# Altium schematic symbol library SCHLIB.SchLib: 2608 symbols (part 18 of 20)
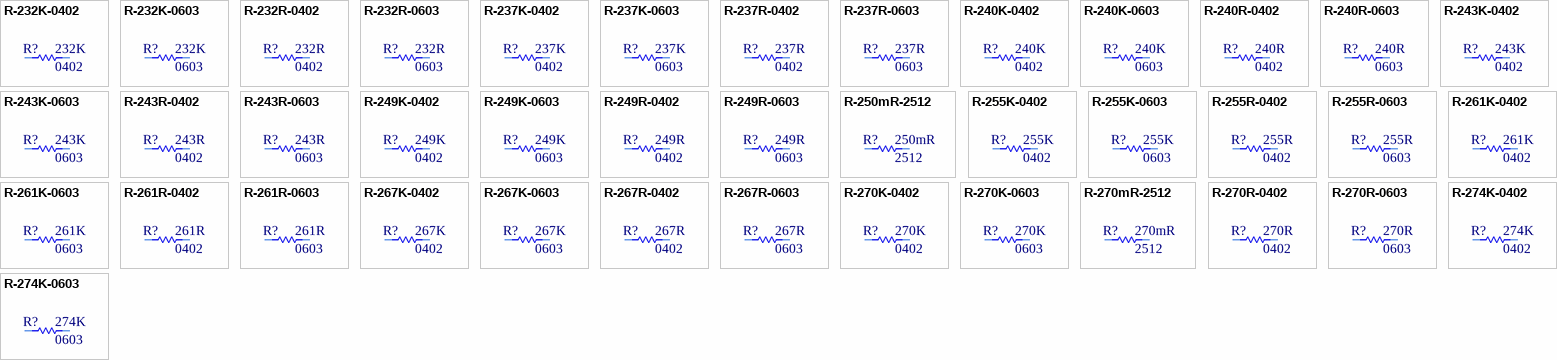
[diagram p100: symbols R-232K-0402 to R-274K-0603]

## R-240K-0402
designator R?, comment Package: 0402  (hidden comment: 240K)
RES 240K OHM 1% 1/16W 0402; Manufacturer Part Number: RC0402FR-07240KL; Manufacturer: YAGEO; Tolerance: 0.01; Power: 0.063W; Temperature Coefficient: ±100ppm/°C; Object  Type: Part; Design Item ID: R-240K-0402; Value: 240K; Composition: Thick Film; Features: Moisture Resistant; Operating Temperature: -55°C ~ 155°C; Height - Seated (Max): 0.40mm; Category: Resistor
footprint R0402
pins: 1, 2

## R-240K-0603
designator R?, comment Package: 0603  (hidden comment: 240K)
RES SMD 240K OHM 1% 1/10W 0603; Manufacturer Part Number: CRCW0603240KFKEA; Manufacturer: Vishay Dale; Tolerance: 0.01; Power: 0.1W; Temperature Coefficient: ±100ppm/°C; Object  Type: Part; Design Item ID: R-240K-0603; Value: 240K; Composition: Thick Film; Features: Automotive AEC-Q200; Operating Temperature: -55°C ~ 155°C; Height - Seated (Max): 0.50mm; Category: Resistor
footprint R0603
pins: 1, 2

## R-240R-0402
designator R?, comment Package: 0402  (hidden comment: 240R)
RES 240 OHM 1% 1/16W 0402; Manufacturer Part Number: RC0402FR-07240RL; Manufacturer: YAGEO; Tolerance: 0.01; Power: 0.063W; Temperature Coefficient: ±100ppm/°C; Object  Type: Part; Design Item ID: R-240R-0402; Value: 240R; Composition: Thick Film; Features: Moisture Resistant; Operating Temperature: -55°C ~ 155°C; Height - Seated (Max): 0.40mm; Category: Resistor
footprint R0402
pins: 1, 2

## R-240R-0603
designator R?, comment Package: 0603  (hidden comment: 240R)
RES SMD 240 OHM 1% 1/10W 0603; Manufacturer Part Number: CRCW0603240RFKEA; Manufacturer: Vishay Dale; Tolerance: 0.01; Power: 0.1W; Temperature Coefficient: ±100ppm/°C; Object  Type: Part; Design Item ID: R-240R-0603; Value: 240R; Composition: Thick Film; Features: Automotive AEC-Q200; Operating Temperature: -55°C ~ 155°C; Height - Seated (Max): 0.50mm; Category: Resistor
footprint R0603
pins: 1, 2

## R-243K-0402
designator R?, comment Package: 0402  (hidden comment: 243K)
RES 243K OHM 1% 1/16W 0402; Manufacturer Part Number: RC0402FR-07243KL; Manufacturer: YAGEO; Tolerance: 0.01; Power: 0.063W; Temperature Coefficient: ±100ppm/°C; Object  Type: Part; Design Item ID: R-243K-0402; Value: 243K; Composition: Thick Film; Features: Moisture Resistant; Operating Temperature: -55°C ~ 155°C; Height - Seated (Max): 0.40mm; Category: Resistor
footprint R0402
pins: 1, 2

## R-243K-0603
designator R?, comment Package: 0603  (hidden comment: 243K)
RES SMD 243K OHM 1% 1/10W 0603; Manufacturer Part Number: CRCW0603243KFKEA; Manufacturer: Vishay Dale; Tolerance: 0.01; Power: 0.1W; Temperature Coefficient: ±100ppm/°C; Object  Type: Part; Design Item ID: R-243K-0603; Value: 243K; Composition: Thick Film; Features: Automotive AEC-Q200; Operating Temperature: -55°C ~ 155°C; Height - Seated (Max): 0.50mm; Category: Resistor
footprint R0603
pins: 1, 2

## R-243R-0402
designator R?, comment Package: 0402  (hidden comment: 243R)
RES 243 OHM 1% 1/16W 0402; Manufacturer Part Number: RC0402FR-07243RL; Manufacturer: YAGEO; Tolerance: 0.01; Power: 0.063W; Temperature Coefficient: ±100ppm/°C; Object  Type: Part; Design Item ID: R-243R-0402; Value: 243R; Composition: Thick Film; Features: Moisture Resistant; Operating Temperature: -55°C ~ 155°C; Height - Seated (Max): 0.40mm; Category: Resistor
footprint R0402
pins: 1, 2

## R-243R-0603
designator R?, comment Package: 0603  (hidden comment: 243R)
RES SMD 243 OHM 1% 1/10W 0603; Manufacturer Part Number: CRCW0603243RFKEA; Manufacturer: Vishay Dale; Tolerance: 0.01; Power: 0.1W; Temperature Coefficient: ±100ppm/°C; Object  Type: Part; Design Item ID: R-243R-0603; Value: 243R; Composition: Thick Film; Features: Automotive AEC-Q200; Operating Temperature: -55°C ~ 155°C; Height - Seated (Max): 0.50mm; Category: Resistor
footprint R0603
pins: 1, 2

## R-249K-0402
designator R?, comment Package: 0402  (hidden comment: 249K)
RES 249K OHM 1% 1/16W 0402; Manufacturer Part Number: RC0402FR-07249KL; Manufacturer: YAGEO; Tolerance: 0.01; Power: 0.063W; Temperature Coefficient: ±100ppm/°C; Object  Type: Part; Design Item ID: R-249K-0402; Value: 249K; Composition: Thick Film; Features: Moisture Resistant; Operating Temperature: -55°C ~ 155°C; Height - Seated (Max): 0.40mm; Category: Resistor
footprint R0402
pins: 1, 2

## R-249K-0603
designator R?, comment Package: 0603  (hidden comment: 249K)
RES SMD 249K OHM 1% 1/10W 0603; Manufacturer Part Number: CRCW0603249KFKEA; Manufacturer: Vishay Dale; Tolerance: 0.01; Power: 0.1W; Temperature Coefficient: ±100ppm/°C; Object  Type: Part; Design Item ID: R-249K-0603; Value: 249K; Composition: Thick Film; Features: Automotive AEC-Q200; Operating Temperature: -55°C ~ 155°C; Height - Seated (Max): 0.50mm; Category: Resistor
footprint R0603
pins: 1, 2

## R-249R-0402
designator R?, comment Package: 0402  (hidden comment: 249R)
RES 249 OHM 1% 1/16W 0402; Manufacturer Part Number: RC0402FR-07249RL; Manufacturer: YAGEO; Tolerance: 0.01; Power: 0.063W; Temperature Coefficient: ±100ppm/°C; Object  Type: Part; Design Item ID: R-249R-0402; Value: 249R; Composition: Thick Film; Features: Moisture Resistant; Operating Temperature: -55°C ~ 155°C; Height - Seated (Max): 0.40mm; Category: Resistor
footprint R0402
pins: 1, 2

## R-249R-0603
designator R?, comment Package: 0603  (hidden comment: 249R)
RES SMD 249 OHM 1% 1/10W 0603; Manufacturer Part Number: CRCW0603249RFKEA; Manufacturer: Vishay Dale; Tolerance: 0.01; Power: 0.1W; Temperature Coefficient: ±100ppm/°C; Object  Type: Part; Design Item ID: R-249R-0603; Value: 249R; Composition: Thick Film; Features: Automotive AEC-Q200; Operating Temperature: -55°C ~ 155°C; Height - Seated (Max): 0.50mm; Category: Resistor
footprint R0603
pins: 1, 2

## R-250mR-2512
designator R?, comment Package: 2512  (hidden comment: 250mR)
RES 0.25 OHM 1% 1W 2512; Manufacturer Part Number: WSL2512R2500FEA; Manufacturer: Vishay Dale; Tolerance: 0.01; Temperature Coefficient: ±75ppm/°C; Object  Type: Part; Design Item ID: R-250mR-2512; Value: 250mR; Power: 1W; Composition: Metal Element; Features: Anti-Sulfur, Automotive AEC-Q200, Current Sense, Moisture Resistant, Pulse Withstanding; Operating Temperature: -65°C ~ 170°C; Height - Seated (Max): 0.89mm; Category: Resistor
footprint R2512
pins: 1, 2

## R-255K-0402
designator R?, comment Package: 0402  (hidden comment: 255K)
RES 255K OHM 1% 1/16W 0402; Manufacturer Part Number: RC0402FR-07255KL; Manufacturer: YAGEO; Tolerance: 0.01; Power: 0.063W; Temperature Coefficient: ±100ppm/°C; Object  Type: Part; Design Item ID: R-255K-0402; Value: 255K; Composition: Thick Film; Features: Moisture Resistant; Operating Temperature: -55°C ~ 155°C; Height - Seated (Max): 0.40mm; Category: Resistor
footprint R0402
pins: 1, 2

## R-255K-0603
designator R?, comment Package: 0603  (hidden comment: 255K)
RES SMD 255K OHM 1% 1/10W 0603; Manufacturer Part Number: CRCW0603255KFKEA; Manufacturer: Vishay Dale; Tolerance: 0.01; Power: 0.1W; Temperature Coefficient: ±100ppm/°C; Object  Type: Part; Design Item ID: R-255K-0603; Value: 255K; Composition: Thick Film; Features: Automotive AEC-Q200; Operating Temperature: -55°C ~ 155°C; Height - Seated (Max): 0.50mm; Category: Resistor
footprint R0603
pins: 1, 2

## R-255R-0402
designator R?, comment Package: 0402  (hidden comment: 255R)
RES 255 OHM 1% 1/16W 0402; Manufacturer Part Number: RC0402FR-07255RL; Manufacturer: YAGEO; Tolerance: 0.01; Power: 0.063W; Temperature Coefficient: ±100ppm/°C; Object  Type: Part; Design Item ID: R-255R-0402; Value: 255R; Composition: Thick Film; Features: Moisture Resistant; Operating Temperature: -55°C ~ 155°C; Height - Seated (Max): 0.40mm; Category: Resistor
footprint R0402
pins: 1, 2

## R-255R-0603
designator R?, comment Package: 0603  (hidden comment: 255R)
RES SMD 255 OHM 1% 1/10W 0603; Manufacturer Part Number: CRCW0603255RFKEA; Manufacturer: Vishay Dale; Tolerance: 0.01; Power: 0.1W; Temperature Coefficient: ±100ppm/°C; Object  Type: Part; Design Item ID: R-255R-0603; Value: 255R; Composition: Thick Film; Features: Automotive AEC-Q200; Operating Temperature: -55°C ~ 155°C; Height - Seated (Max): 0.50mm; Category: Resistor
footprint R0603
pins: 1, 2

## R-261K-0402
designator R?, comment Package: 0402  (hidden comment: 261K)
RES 261K OHM 1% 1/16W 0402; Manufacturer Part Number: RC0402FR-07261KL; Manufacturer: YAGEO; Tolerance: 0.01; Power: 0.063W; Temperature Coefficient: ±100ppm/°C; Object  Type: Part; Design Item ID: R-261K-0402; Value: 261K; Composition: Thick Film; Features: Moisture Resistant; Operating Temperature: -55°C ~ 155°C; Height - Seated (Max): 0.40mm; Category: Resistor
footprint R0402
pins: 1, 2

## R-261K-0603
designator R?, comment Package: 0603  (hidden comment: 261K)
RES SMD 261K OHM 1% 1/10W 0603; Manufacturer Part Number: CRCW0603261KFKEA; Manufacturer: Vishay Dale; Tolerance: 0.01; Power: 0.1W; Temperature Coefficient: ±100ppm/°C; Object  Type: Part; Design Item ID: R-261K-0603; Value: 261K; Composition: Thick Film; Features: Automotive AEC-Q200; Operating Temperature: -55°C ~ 155°C; Height - Seated (Max): 0.50mm; Category: Resistor
footprint R0603
pins: 1, 2

## R-261R-0402
designator R?, comment Package: 0402  (hidden comment: 261R)
RES 261 OHM 1% 1/16W 0402; Manufacturer Part Number: RC0402FR-07261RL; Manufacturer: YAGEO; Tolerance: 0.01; Power: 0.063W; Temperature Coefficient: ±100ppm/°C; Object  Type: Part; Design Item ID: R-261R-0402; Value: 261R; Composition: Thick Film; Features: Moisture Resistant; Operating Temperature: -55°C ~ 155°C; Height - Seated (Max): 0.40mm; Category: Resistor
footprint R0402
pins: 1, 2

## R-261R-0603
designator R?, comment Package: 0603  (hidden comment: 261R)
RES SMD 261 OHM 1% 1/10W 0603; Manufacturer Part Number: CRCW0603261RFKEA; Manufacturer: Vishay Dale; Tolerance: 0.01; Power: 0.1W; Temperature Coefficient: ±100ppm/°C; Object  Type: Part; Design Item ID: R-261R-0603; Value: 261R; Composition: Thick Film; Features: Automotive AEC-Q200; Operating Temperature: -55°C ~ 155°C; Height - Seated (Max): 0.50mm; Category: Resistor
footprint R0603
pins: 1, 2

## R-267K-0402
designator R?, comment Package: 0402  (hidden comment: 267K)
RES 267K OHM 1% 1/16W 0402; Manufacturer Part Number: RC0402FR-07267KL; Manufacturer: YAGEO; Tolerance: 0.01; Power: 0.063W; Temperature Coefficient: ±100ppm/°C; Object  Type: Part; Design Item ID: R-267K-0402; Value: 267K; Composition: Thick Film; Features: Moisture Resistant; Operating Temperature: -55°C ~ 155°C; Height - Seated (Max): 0.40mm; Category: Resistor
footprint R0402
pins: 1, 2

## R-267K-0603
designator R?, comment Package: 0603  (hidden comment: 267K)
RES SMD 267K OHM 1% 1/10W 0603; Manufacturer Part Number: CRCW0603267KFKEA; Manufacturer: Vishay Dale; Tolerance: 0.01; Power: 0.1W; Temperature Coefficient: ±100ppm/°C; Object  Type: Part; Design Item ID: R-267K-0603; Value: 267K; Composition: Thick Film; Features: Automotive AEC-Q200; Operating Temperature: -55°C ~ 155°C; Height - Seated (Max): 0.50mm; Category: Resistor
footprint R0603
pins: 1, 2

## R-267R-0402
designator R?, comment Package: 0402  (hidden comment: 267R)
RES 267 OHM 1% 1/16W 0402; Manufacturer Part Number: RC0402FR-07267RL; Manufacturer: YAGEO; Tolerance: 0.01; Power: 0.063W; Temperature Coefficient: ±100ppm/°C; Object  Type: Part; Design Item ID: R-267R-0402; Value: 267R; Composition: Thick Film; Features: Moisture Resistant; Operating Temperature: -55°C ~ 155°C; Height - Seated (Max): 0.40mm; Category: Resistor
footprint R0402
pins: 1, 2

## R-267R-0603
designator R?, comment Package: 0603  (hidden comment: 267R)
RES SMD 267 OHM 1% 1/10W 0603; Manufacturer Part Number: CRCW0603267RFKEA; Manufacturer: Vishay Dale; Tolerance: 0.01; Power: 0.1W; Temperature Coefficient: ±100ppm/°C; Object  Type: Part; Design Item ID: R-267R-0603; Value: 267R; Composition: Thick Film; Features: Automotive AEC-Q200; Operating Temperature: -55°C ~ 155°C; Height - Seated (Max): 0.50mm; Category: Resistor
footprint R0603
pins: 1, 2

## R-270K-0402
designator R?, comment Package: 0402  (hidden comment: 270K)
RES 270K OHM 1% 1/16W 0402; Manufacturer Part Number: RC0402FR-07270KL; Manufacturer: YAGEO; Tolerance: 0.01; Power: 0.063W; Temperature Coefficient: ±100ppm/°C; Object  Type: Part; Design Item ID: R-270K-0402; Value: 270K; Composition: Thick Film; Features: Moisture Resistant; Operating Temperature: -55°C ~ 155°C; Height - Seated (Max): 0.40mm; Category: Resistor
footprint R0402
pins: 1, 2

## R-270K-0603
designator R?, comment Package: 0603  (hidden comment: 270K)
RES SMD 270K OHM 1% 1/10W 0603; Manufacturer Part Number: CRCW0603270KFKEA; Manufacturer: Vishay Dale; Tolerance: 0.01; Power: 0.1W; Temperature Coefficient: ±100ppm/°C; Object  Type: Part; Design Item ID: R-270K-0603; Value: 270K; Composition: Thick Film; Features: Automotive AEC-Q200; Operating Temperature: -55°C ~ 155°C; Height - Seated (Max): 0.50mm; Category: Resistor
footprint R0603
pins: 1, 2

## R-270mR-2512
designator R?, comment Package: 2512  (hidden comment: 270mR)
RES 0.27 OHM 1% 1W 2512; Manufacturer Part Number: WSL2512R2700FEA; Manufacturer: Vishay Dale; Tolerance: 0.01; Temperature Coefficient: ±75ppm/°C; Object  Type: Part; Design Item ID: R-270mR-2512; Value: 270mR; Power: 1W; Composition: Metal Element; Features: Anti-Sulfur, Automotive AEC-Q200, Current Sense, Moisture Resistant, Pulse Withstanding; Operating Temperature: -65°C ~ 170°C; Height - Seated (Max): 0.89mm; Category: Resistor
footprint R2512
pins: 1, 2

## R-270R-0402
designator R?, comment Package: 0402  (hidden comment: 270R)
RES 270 OHM 1% 1/16W 0402; Manufacturer Part Number: RC0402FR-07270RL; Manufacturer: YAGEO; Tolerance: 0.01; Power: 0.063W; Temperature Coefficient: ±100ppm/°C; Object  Type: Part; Design Item ID: R-270R-0402; Value: 270R; Composition: Thick Film; Features: Moisture Resistant; Operating Temperature: -55°C ~ 155°C; Height - Seated (Max): 0.40mm; Category: Resistor
footprint R0402
pins: 1, 2

## R-270R-0603
designator R?, comment Package: 0603  (hidden comment: 270R)
RES SMD 270 OHM 1% 1/10W 0603; Manufacturer Part Number: CRCW0603270RFKEA; Manufacturer: Vishay Dale; Tolerance: 0.01; Power: 0.1W; Temperature Coefficient: ±100ppm/°C; Object  Type: Part; Design Item ID: R-270R-0603; Value: 270R; Composition: Thick Film; Features: Automotive AEC-Q200; Operating Temperature: -55°C ~ 155°C; Height - Seated (Max): 0.50mm; Category: Resistor
footprint R0603
pins: 1, 2

## R-274K-0402
designator R?, comment Package: 0402  (hidden comment: 274K)
RES 274K OHM 1% 1/16W 0402; Manufacturer Part Number: RC0402FR-07274KL; Manufacturer: YAGEO; Tolerance: 0.01; Power: 0.063W; Temperature Coefficient: ±100ppm/°C; Object  Type: Part; Design Item ID: R-274K-0402; Value: 274K; Composition: Thick Film; Features: Moisture Resistant; Operating Temperature: -55°C ~ 155°C; Height - Seated (Max): 0.40mm; Category: Resistor
footprint R0402
pins: 1, 2

## R-274K-0603
designator R?, comment Package: 0603  (hidden comment: 274K)
RES SMD 274K OHM 1% 1/10W 0603; Manufacturer Part Number: CRCW0603274KFKEA; Manufacturer: Vishay Dale; Tolerance: 0.01; Power: 0.1W; Temperature Coefficient: ±100ppm/°C; Object  Type: Part; Design Item ID: R-274K-0603; Value: 274K; Composition: Thick Film; Features: Automotive AEC-Q200; Operating Temperature: -55°C ~ 155°C; Height - Seated (Max): 0.50mm; Category: Resistor
footprint R0603
pins: 1, 2

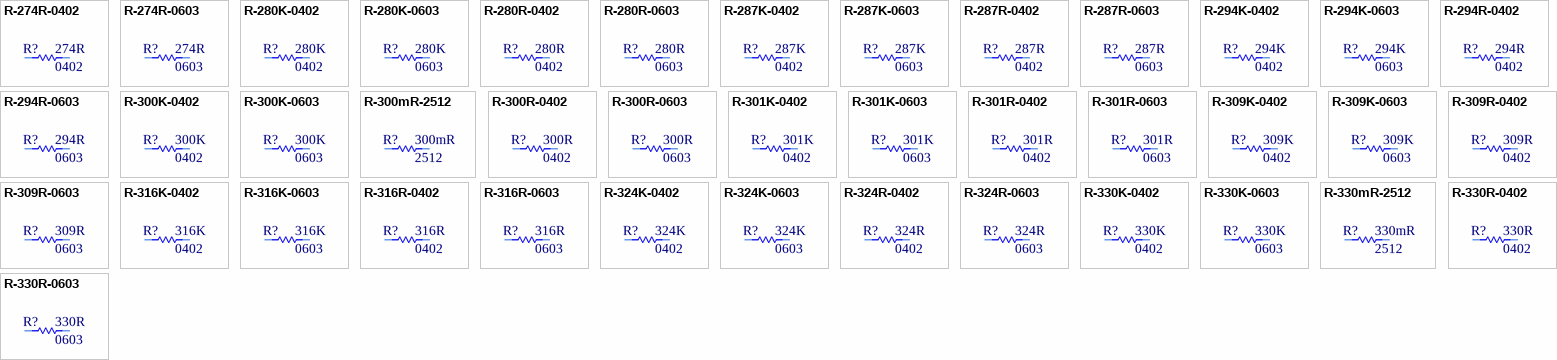
[diagram p75: symbols R-274R-0402 to R-330R-0603]

## R-274R-0402
designator R?, comment Package: 0402  (hidden comment: 274R)
RES 274 OHM 1% 1/16W 0402; Manufacturer Part Number: RC0402FR-07274RL; Manufacturer: YAGEO; Tolerance: 0.01; Power: 0.063W; Temperature Coefficient: ±100ppm/°C; Object  Type: Part; Design Item ID: R-274R-0402; Value: 274R; Composition: Thick Film; Features: Moisture Resistant; Operating Temperature: -55°C ~ 155°C; Height - Seated (Max): 0.40mm; Category: Resistor
footprint R0402
pins: 1, 2

## R-274R-0603
designator R?, comment Package: 0603  (hidden comment: 274R)
RES SMD 274 OHM 1% 1/10W 0603; Manufacturer Part Number: CRCW0603274RFKEA; Manufacturer: Vishay Dale; Tolerance: 0.01; Power: 0.1W; Temperature Coefficient: ±100ppm/°C; Object  Type: Part; Design Item ID: R-274R-0603; Value: 274R; Composition: Thick Film; Features: Automotive AEC-Q200; Operating Temperature: -55°C ~ 155°C; Height - Seated (Max): 0.50mm; Category: Resistor
footprint R0603
pins: 1, 2

## R-280K-0402
designator R?, comment Package: 0402  (hidden comment: 280K)
RES 280K OHM 1% 1/16W 0402; Manufacturer Part Number: RC0402FR-07280KL; Manufacturer: YAGEO; Tolerance: 0.01; Power: 0.063W; Temperature Coefficient: ±100ppm/°C; Object  Type: Part; Design Item ID: R-280K-0402; Value: 280K; Composition: Thick Film; Features: Moisture Resistant; Operating Temperature: -55°C ~ 155°C; Height - Seated (Max): 0.40mm; Category: Resistor
footprint R0402
pins: 1, 2

## R-280K-0603
designator R?, comment Package: 0603  (hidden comment: 280K)
RES SMD 280K OHM 1% 1/10W 0603; Manufacturer Part Number: CRCW0603280KFKEA; Manufacturer: Vishay Dale; Tolerance: 0.01; Power: 0.1W; Temperature Coefficient: ±100ppm/°C; Object  Type: Part; Design Item ID: R-280K-0603; Value: 280K; Composition: Thick Film; Features: Automotive AEC-Q200; Operating Temperature: -55°C ~ 155°C; Height - Seated (Max): 0.50mm; Category: Resistor
footprint R0603
pins: 1, 2

## R-280R-0402
designator R?, comment Package: 0402  (hidden comment: 280R)
RES 280 OHM 1% 1/16W 0402; Manufacturer Part Number: RC0402FR-07280RL; Manufacturer: YAGEO; Tolerance: 0.01; Power: 0.063W; Temperature Coefficient: ±100ppm/°C; Object  Type: Part; Design Item ID: R-280R-0402; Value: 280R; Composition: Thick Film; Features: Moisture Resistant; Operating Temperature: -55°C ~ 155°C; Height - Seated (Max): 0.40mm; Category: Resistor
footprint R0402
pins: 1, 2

## R-280R-0603
designator R?, comment Package: 0603  (hidden comment: 280R)
RES SMD 280 OHM 1% 1/10W 0603; Manufacturer Part Number: CRCW0603280RFKEA; Manufacturer: Vishay Dale; Tolerance: 0.01; Power: 0.1W; Temperature Coefficient: ±100ppm/°C; Object  Type: Part; Design Item ID: R-280R-0603; Value: 280R; Composition: Thick Film; Features: Automotive AEC-Q200; Operating Temperature: -55°C ~ 155°C; Height - Seated (Max): 0.50mm; Category: Resistor
footprint R0603
pins: 1, 2

## R-287K-0402
designator R?, comment Package: 0402  (hidden comment: 287K)
RES 287K OHM 1% 1/16W 0402; Manufacturer Part Number: RC0402FR-07287KL; Manufacturer: YAGEO; Tolerance: 0.01; Power: 0.063W; Temperature Coefficient: ±100ppm/°C; Object  Type: Part; Design Item ID: R-287K-0402; Value: 287K; Composition: Thick Film; Features: Moisture Resistant; Operating Temperature: -55°C ~ 155°C; Height - Seated (Max): 0.40mm; Category: Resistor
footprint R0402
pins: 1, 2

## R-287K-0603
designator R?, comment Package: 0603  (hidden comment: 287K)
RES SMD 287K OHM 1% 1/10W 0603; Manufacturer Part Number: CRCW0603287KFKEA; Manufacturer: Vishay Dale; Tolerance: 0.01; Power: 0.1W; Temperature Coefficient: ±100ppm/°C; Object  Type: Part; Design Item ID: R-287K-0603; Composition: Thick Film; Features: Automotive AEC-Q200; Operating Temperature: -55°C ~ 155°C; Height - Seated (Max): 0.50mm; Category: Resistor; Value: 287K
footprint R0603
pins: 1, 2

## R-287R-0402
designator R?, comment Package: 0402  (hidden comment: 287R)
RES 287 OHM 1% 1/16W 0402; Manufacturer Part Number: RC0402FR-07287RL; Manufacturer: YAGEO; Tolerance: 0.01; Power: 0.063W; Temperature Coefficient: ±100ppm/°C; Object  Type: Part; Design Item ID: R-287R-0402; Value: 287R; Composition: Thick Film; Features: Moisture Resistant; Operating Temperature: -55°C ~ 155°C; Height - Seated (Max): 0.40mm; Category: Resistor
footprint R0402
pins: 1, 2

## R-287R-0603
designator R?, comment Package: 0603  (hidden comment: 287R)
RES SMD 287 OHM 1% 1/10W 0603; Manufacturer Part Number: CRCW0603287RFKEA; Manufacturer: Vishay Dale; Tolerance: 0.01; Power: 0.1W; Temperature Coefficient: ±100ppm/°C; Object  Type: Part; Design Item ID: R-287R-0603; Value: 287R; Composition: Thick Film; Features: Automotive AEC-Q200; Operating Temperature: -55°C ~ 155°C; Height - Seated (Max): 0.50mm; Category: Resistor
footprint R0603
pins: 1, 2

## R-294K-0402
designator R?, comment Package: 0402  (hidden comment: 294K)
RES 294K OHM 1% 1/16W 0402; Manufacturer Part Number: RC0402FR-07294KL; Manufacturer: YAGEO; Tolerance: 0.01; Power: 0.063W; Temperature Coefficient: ±100ppm/°C; Object  Type: Part; Design Item ID: R-294K-0402; Value: 294K; Composition: Thick Film; Features: Moisture Resistant; Operating Temperature: -55°C ~ 155°C; Height - Seated (Max): 0.40mm; Category: Resistor
footprint R0402
pins: 1, 2

## R-294K-0603
designator R?, comment Package: 0603  (hidden comment: 294K)
RES SMD 294K OHM 1% 1/10W 0603; Manufacturer Part Number: CRCW0603294KFKEA; Manufacturer: Vishay Dale; Tolerance: 0.01; Power: 0.1W; Temperature Coefficient: ±100ppm/°C; Object  Type: Part; Design Item ID: R-294K-0603; Value: 294K; Composition: Thick Film; Features: Automotive AEC-Q200; Operating Temperature: -55°C ~ 155°C; Height - Seated (Max): 0.50mm; Category: Resistor
footprint R0603
pins: 1, 2

## R-294R-0402
designator R?, comment Package: 0402  (hidden comment: 294R)
RES 294 OHM 1% 1/16W 0402; Manufacturer Part Number: RC0402FR-07294RL; Manufacturer: YAGEO; Tolerance: 0.01; Power: 0.063W; Temperature Coefficient: ±100ppm/°C; Object  Type: Part; Design Item ID: R-294R-0402; Value: 294R; Composition: Thick Film; Features: Moisture Resistant; Operating Temperature: -55°C ~ 155°C; Height - Seated (Max): 0.40mm; Category: Resistor
footprint R0402
pins: 1, 2

## R-294R-0603
designator R?, comment Package: 0603  (hidden comment: 294R)
RES SMD 294 OHM 1% 1/10W 0603; Manufacturer Part Number: CRCW0603294RFKEA; Manufacturer: Vishay Dale; Tolerance: 0.01; Power: 0.1W; Temperature Coefficient: ±100ppm/°C; Object  Type: Part; Design Item ID: R-294R-0603; Value: 294R; Composition: Thick Film; Features: Automotive AEC-Q200; Operating Temperature: -55°C ~ 155°C; Height - Seated (Max): 0.50mm; Category: Resistor
footprint R0603
pins: 1, 2

## R-300K-0402
designator R?, comment Package: 0402  (hidden comment: 300K)
RES 300K OHM 1% 1/16W 0402; Manufacturer Part Number: RC0402FR-07300KL; Manufacturer: YAGEO; Tolerance: 0.01; Power: 0.063W; Temperature Coefficient: ±100ppm/°C; Object  Type: Part; Design Item ID: R-300K-0402; Value: 300K; Composition: Thick Film; Features: Moisture Resistant; Operating Temperature: -55°C ~ 155°C; Height - Seated (Max): 0.40mm; Category: Resistor
footprint R0402
pins: 1, 2

## R-300K-0603
designator R?, comment Package: 0603  (hidden comment: 300K)
RES SMD 300K OHM 1% 1/10W 0603; Manufacturer Part Number: CRCW0603300KFKEA; Manufacturer: Vishay Dale; Tolerance: 0.01; Power: 0.1W; Temperature Coefficient: ±100ppm/°C; Object  Type: Part; Design Item ID: R-300K-0603; Value: 300K; Composition: Thick Film; Features: Automotive AEC-Q200; Operating Temperature: -55°C ~ 155°C; Height - Seated (Max): 0.50mm; Category: Resistor
footprint R0603
pins: 1, 2

## R-300mR-2512
designator R?, comment Package: 2512  (hidden comment: 300mR)
RES 0.3 OHM 1% 1W 2512; Manufacturer Part Number: WSL2512R3000FEA; Manufacturer: Vishay Dale; Tolerance: 0.01; Temperature Coefficient: ±75ppm/°C; Object  Type: Part; Design Item ID: R-300mR-2512; Value: 300mR; Power: 1W; Composition: Metal Element; Features: Anti-Sulfur, Automotive AEC-Q200, Current Sense, Moisture Resistant, Pulse Withstanding; Operating Temperature: -65°C ~ 170°C; Height - Seated (Max): 0.89mm; Category: Resistor
footprint R2512
pins: 1, 2

## R-300R-0402
designator R?, comment Package: 0402  (hidden comment: 300R)
RES 300 OHM 1% 1/16W 0402; Manufacturer Part Number: RC0402FR-07300RL; Manufacturer: YAGEO; Tolerance: 0.01; Power: 0.063W; Temperature Coefficient: ±100ppm/°C; Object  Type: Part; Design Item ID: R-300R-0402; Value: 300R; Composition: Thick Film; Features: Moisture Resistant; Operating Temperature: -55°C ~ 155°C; Height - Seated (Max): 0.40mm; Category: Resistor
footprint R0402
pins: 1, 2

## R-300R-0603
designator R?, comment Package: 0603  (hidden comment: 300R)
RES SMD 300 OHM 1% 1/10W 0603; Manufacturer Part Number: CRCW0603300RFKEA; Manufacturer: Vishay Dale; Tolerance: 0.01; Power: 0.1W; Temperature Coefficient: ±100ppm/°C; Object  Type: Part; Design Item ID: R-300R-0603; Value: 300R; Composition: Thick Film; Features: Automotive AEC-Q200; Operating Temperature: -55°C ~ 155°C; Height - Seated (Max): 0.50mm; Category: Resistor
footprint R0603
pins: 1, 2

## R-301K-0402
designator R?, comment Package: 0402  (hidden comment: 301K)
RES 301K OHM 1% 1/16W 0402; Manufacturer Part Number: RC0402FR-07301KL; Manufacturer: YAGEO; Tolerance: 0.01; Power: 0.063W; Temperature Coefficient: ±100ppm/°C; Object  Type: Part; Design Item ID: R-301K-0402; Value: 301K; Composition: Thick Film; Features: Moisture Resistant; Operating Temperature: -55°C ~ 155°C; Height - Seated (Max): 0.40mm; Category: Resistor
footprint R0402
pins: 1, 2

## R-301K-0603
designator R?, comment Package: 0603  (hidden comment: 301K)
RES SMD 301K OHM 1% 1/10W 0603; Manufacturer Part Number: CRCW0603301KFKEA; Manufacturer: Vishay Dale; Tolerance: 0.01; Power: 0.1W; Temperature Coefficient: ±100ppm/°C; Object  Type: Part; Design Item ID: R-301K-0603; Value: 301K; Composition: Thick Film; Features: Automotive AEC-Q200; Operating Temperature: -55°C ~ 155°C; Height - Seated (Max): 0.50mm; Category: Resistor
footprint R0603
pins: 1, 2

## R-301R-0402
designator R?, comment Package: 0402  (hidden comment: 301R)
RES 301 OHM 1% 1/16W 0402; Manufacturer Part Number: RC0402FR-07301RL; Manufacturer: YAGEO; Tolerance: 0.01; Power: 0.063W; Temperature Coefficient: ±100ppm/°C; Object  Type: Part; Design Item ID: R-301R-0402; Value: 301R; Composition: Thick Film; Features: Moisture Resistant; Operating Temperature: -55°C ~ 155°C; Height - Seated (Max): 0.40mm; Category: Resistor
footprint R0402
pins: 1, 2

## R-301R-0603
designator R?, comment Package: 0603  (hidden comment: 301R)
RES SMD 301 OHM 1% 1/10W 0603; Manufacturer Part Number: CRCW0603301RFKEA; Manufacturer: Vishay Dale; Tolerance: 0.01; Power: 0.1W; Temperature Coefficient: ±100ppm/°C; Object  Type: Part; Design Item ID: R-301R-0603; Value: 301R; Composition: Thick Film; Features: Automotive AEC-Q200; Operating Temperature: -55°C ~ 155°C; Height - Seated (Max): 0.50mm; Category: Resistor
footprint R0603
pins: 1, 2

## R-309K-0402
designator R?, comment Package: 0402  (hidden comment: 309K)
RES 309K OHM 1% 1/16W 0402; Manufacturer Part Number: RC0402FR-07309KL; Manufacturer: YAGEO; Tolerance: 0.01; Power: 0.063W; Temperature Coefficient: ±100ppm/°C; Object  Type: Part; Design Item ID: R-309K-0402; Value: 309K; Composition: Thick Film; Features: Moisture Resistant; Operating Temperature: -55°C ~ 155°C; Height - Seated (Max): 0.40mm; Category: Resistor
footprint R0402
pins: 1, 2

## R-309K-0603
designator R?, comment Package: 0603  (hidden comment: 309K)
RES SMD 309K OHM 1% 1/10W 0603; Manufacturer Part Number: CRCW0603309KFKEA; Manufacturer: Vishay Dale; Tolerance: 0.01; Power: 0.1W; Temperature Coefficient: ±100ppm/°C; Object  Type: Part; Design Item ID: R-309K-0603; Value: 309K; Composition: Thick Film; Features: Automotive AEC-Q200; Operating Temperature: -55°C ~ 155°C; Height - Seated (Max): 0.50mm; Category: Resistor
footprint R0603
pins: 1, 2

## R-309R-0402
designator R?, comment Package: 0402  (hidden comment: 309R)
RES 309 OHM 1% 1/16W 0402; Manufacturer Part Number: RC0402FR-07309RL; Manufacturer: YAGEO; Tolerance: 0.01; Power: 0.063W; Temperature Coefficient: ±100ppm/°C; Object  Type: Part; Design Item ID: R-309R-0402; Value: 309R; Composition: Thick Film; Features: Moisture Resistant; Operating Temperature: -55°C ~ 155°C; Height - Seated (Max): 0.40mm; Category: Resistor
footprint R0402
pins: 1, 2

## R-309R-0603
designator R?, comment Package: 0603  (hidden comment: 309R)
RES SMD 309 OHM 1% 1/10W 0603; Manufacturer Part Number: CRCW0603309RFKEA; Manufacturer: Vishay Dale; Tolerance: 0.01; Power: 0.1W; Temperature Coefficient: ±100ppm/°C; Object  Type: Part; Design Item ID: R-309R-0603; Value: 309R; Composition: Thick Film; Features: Automotive AEC-Q200; Operating Temperature: -55°C ~ 155°C; Height - Seated (Max): 0.50mm; Category: Resistor
footprint R0603
pins: 1, 2

## R-316K-0402
designator R?, comment Package: 0402  (hidden comment: 316K)
RES 316K OHM 1% 1/16W 0402; Manufacturer Part Number: RC0402FR-07316KL; Manufacturer: YAGEO; Tolerance: 0.01; Power: 0.063W; Temperature Coefficient: ±100ppm/°C; Object  Type: Part; Design Item ID: R-316K-0402; Value: 316K; Composition: Thick Film; Features: Moisture Resistant; Operating Temperature: -55°C ~ 155°C; Height - Seated (Max): 0.40mm; Category: Resistor
footprint R0402
pins: 1, 2

## R-316K-0603
designator R?, comment Package: 0603  (hidden comment: 316K)
RES SMD 316K OHM 1% 1/10W 0603; Manufacturer Part Number: CRCW0603316KFKEA; Manufacturer: Vishay Dale; Tolerance: 0.01; Power: 0.1W; Temperature Coefficient: ±100ppm/°C; Object  Type: Part; Design Item ID: R-316K-0603; Value: 316K; Composition: Thick Film; Features: Automotive AEC-Q200; Operating Temperature: -55°C ~ 155°C; Height - Seated (Max): 0.50mm; Category: Resistor
footprint R0603
pins: 1, 2

## R-316R-0402
designator R?, comment Package: 0402  (hidden comment: 316R)
RES 316 OHM 1% 1/16W 0402; Manufacturer Part Number: RC0402FR-07316RL; Manufacturer: YAGEO; Tolerance: 0.01; Power: 0.063W; Temperature Coefficient: ±100ppm/°C; Object  Type: Part; Design Item ID: R-316R-0402; Value: 316R; Composition: Thick Film; Features: Moisture Resistant; Operating Temperature: -55°C ~ 155°C; Height - Seated (Max): 0.40mm; Category: Resistor
footprint R0402
pins: 1, 2

## R-316R-0603
designator R?, comment Package: 0603  (hidden comment: 316R)
RES SMD 316 OHM 1% 1/10W 0603; Manufacturer Part Number: CRCW0603316RFKEA; Manufacturer: Vishay Dale; Tolerance: 0.01; Power: 0.1W; Temperature Coefficient: ±100ppm/°C; Object  Type: Part; Design Item ID: R-316R-0603; Value: 316R; Composition: Thick Film; Features: Automotive AEC-Q200; Operating Temperature: -55°C ~ 155°C; Height - Seated (Max): 0.50mm; Category: Resistor
footprint R0603
pins: 1, 2

## R-324K-0402
designator R?, comment Package: 0402  (hidden comment: 324K)
RES 324K OHM 1% 1/16W 0402; Manufacturer Part Number: RC0402FR-07324KL; Manufacturer: YAGEO; Tolerance: 0.01; Power: 0.063W; Temperature Coefficient: ±100ppm/°C; Object  Type: Part; Design Item ID: R-324K-0402; Value: 324K; Composition: Thick Film; Features: Moisture Resistant; Operating Temperature: -55°C ~ 155°C; Height - Seated (Max): 0.40mm; Category: Resistor
footprint R0402
pins: 1, 2

## R-324K-0603
designator R?, comment Package: 0603  (hidden comment: 324K)
RES SMD 324K OHM 1% 1/10W 0603; Manufacturer Part Number: CRCW0603324KFKEA; Manufacturer: Vishay Dale; Tolerance: 0.01; Power: 0.1W; Temperature Coefficient: ±100ppm/°C; Object  Type: Part; Design Item ID: R-324K-0603; Value: 324K; Composition: Thick Film; Features: Automotive AEC-Q200; Operating Temperature: -55°C ~ 155°C; Height - Seated (Max): 0.50mm; Category: Resistor
footprint R0603
pins: 1, 2

## R-324R-0402
designator R?, comment Package: 0402  (hidden comment: 324R)
RES 324 OHM 1% 1/16W 0402; Manufacturer Part Number: RC0402FR-07324RL; Manufacturer: YAGEO; Tolerance: 0.01; Power: 0.063W; Temperature Coefficient: ±100ppm/°C; Object  Type: Part; Design Item ID: R-324R-0402; Value: 324R; Composition: Thick Film; Features: Moisture Resistant; Operating Temperature: -55°C ~ 155°C; Height - Seated (Max): 0.40mm; Category: Resistor
footprint R0402
pins: 1, 2

## R-324R-0603
designator R?, comment Package: 0603  (hidden comment: 324R)
RES SMD 324 OHM 1% 1/10W 0603; Manufacturer Part Number: CRCW0603324RFKEA; Manufacturer: Vishay Dale; Tolerance: 0.01; Power: 0.1W; Temperature Coefficient: ±100ppm/°C; Object  Type: Part; Design Item ID: R-324R-0603; Value: 324R; Composition: Thick Film; Features: Automotive AEC-Q200; Operating Temperature: -55°C ~ 155°C; Height - Seated (Max): 0.50mm; Category: Resistor
footprint R0603
pins: 1, 2

## R-330K-0402
designator R?, comment Package: 0402  (hidden comment: 330K)
RES 330K OHM 1% 1/16W 0402; Manufacturer Part Number: RC0402FR-07330KL; Manufacturer: YAGEO; Tolerance: 0.01; Power: 0.063W; Temperature Coefficient: ±100ppm/°C; Object  Type: Part; Design Item ID: R-330K-0402; Value: 330K; Composition: Thick Film; Features: Moisture Resistant; Operating Temperature: -55°C ~ 155°C; Height - Seated (Max): 0.40mm; Category: Resistor
footprint R0402
pins: 1, 2

## R-330K-0603
designator R?, comment Package: 0603  (hidden comment: 330K)
RES SMD 330K OHM 1% 1/10W 0603; Manufacturer Part Number: CRCW0603330KFKEA; Manufacturer: Vishay Dale; Tolerance: 0.01; Power: 0.1W; Temperature Coefficient: ±100ppm/°C; Object  Type: Part; Design Item ID: R-330K-0603; Value: 330K; Composition: Thick Film; Features: Automotive AEC-Q200; Operating Temperature: -55°C ~ 155°C; Height - Seated (Max): 0.50mm; Category: Resistor
footprint R0603
pins: 1, 2

## R-330mR-2512
designator R?, comment Package: 2512  (hidden comment: 330mR)
RES 0.33 OHM 1% 1W 2512; Manufacturer Part Number: WSL2512R3300FEA; Manufacturer: Vishay Dale; Tolerance: 0.01; Temperature Coefficient: ±75ppm/°C; Object  Type: Part; Design Item ID: R-330mR-2512; Value: 330mR; Power: 1W; Composition: Metal Element; Features: Anti-Sulfur, Automotive AEC-Q200, Current Sense, Moisture Resistant, Pulse Withstanding; Operating Temperature: -65°C ~ 170°C; Height - Seated (Max): 0.89mm; Category: Resistor
footprint R2512
pins: 1, 2

## R-330R-0402
designator R?, comment Package: 0402  (hidden comment: 330R)
RES 330 OHM 1% 1/16W 0402; Manufacturer Part Number: RC0402FR-07330RL; Manufacturer: YAGEO; Tolerance: 0.01; Power: 0.063W; Temperature Coefficient: ±100ppm/°C; Object  Type: Part; Design Item ID: R-330R-0402; Value: 330R; Composition: Thick Film; Features: Moisture Resistant; Operating Temperature: -55°C ~ 155°C; Height - Seated (Max): 0.40mm; Category: Resistor
footprint R0402
pins: 1, 2

## R-330R-0603
designator R?, comment Package: 0603  (hidden comment: 330R)
RES SMD 330 OHM 1% 1/10W 0603; Manufacturer Part Number: CRCW0603330RFKEA; Manufacturer: Vishay Dale; Tolerance: 0.01; Power: 0.1W; Temperature Coefficient: ±100ppm/°C; Object  Type: Part; Design Item ID: R-330R-0603; Value: 330R; Composition: Thick Film; Features: Automotive AEC-Q200; Operating Temperature: -55°C ~ 155°C; Height - Seated (Max): 0.50mm; Category: Resistor
footprint R0603
pins: 1, 2

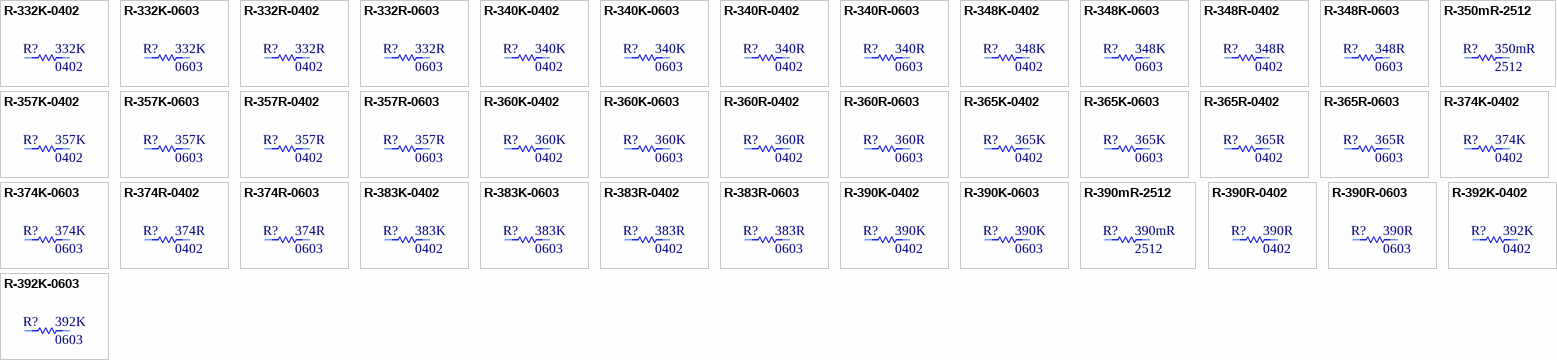
[diagram p76: symbols R-332K-0402 to R-392K-0603]

## R-332K-0402
designator R?, comment Package: 0402  (hidden comment: 332K)
RES 332K OHM 1% 1/16W 0402; Manufacturer Part Number: RC0402FR-07332KL; Manufacturer: YAGEO; Tolerance: 0.01; Power: 0.063W; Temperature Coefficient: ±100ppm/°C; Object  Type: Part; Design Item ID: R-332K-0402; Value: 332K; Composition: Thick Film; Features: Moisture Resistant; Operating Temperature: -55°C ~ 155°C; Height - Seated (Max): 0.40mm; Category: Resistor
footprint R0402
pins: 1, 2

## R-332K-0603
designator R?, comment Package: 0603  (hidden comment: 332K)
RES SMD 332K OHM 1% 1/10W 0603; Manufacturer Part Number: CRCW0603332KFKEA; Manufacturer: Vishay Dale; Tolerance: 0.01; Power: 0.1W; Temperature Coefficient: ±100ppm/°C; Object  Type: Part; Design Item ID: R-332K-0603; Value: 332K; Composition: Thick Film; Features: Automotive AEC-Q200; Operating Temperature: -55°C ~ 155°C; Height - Seated (Max): 0.50mm; Category: Resistor
footprint R0603
pins: 1, 2

## R-332R-0402
designator R?, comment Package: 0402  (hidden comment: 332R)
RES 332 OHM 1% 1/16W 0402; Manufacturer Part Number: RC0402FR-07332RL; Manufacturer: YAGEO; Tolerance: 0.01; Power: 0.063W; Temperature Coefficient: ±100ppm/°C; Object  Type: Part; Design Item ID: R-332R-0402; Value: 332R; Composition: Thick Film; Features: Moisture Resistant; Operating Temperature: -55°C ~ 155°C; Height - Seated (Max): 0.40mm; Category: Resistor
footprint R0402
pins: 1, 2

## R-332R-0603
designator R?, comment Package: 0603  (hidden comment: 332R)
RES SMD 332 OHM 1% 1/10W 0603; Manufacturer Part Number: CRCW0603332RFKEA; Manufacturer: Vishay Dale; Tolerance: 0.01; Power: 0.1W; Temperature Coefficient: ±100ppm/°C; Object  Type: Part; Design Item ID: R-332R-0603; Value: 332R; Composition: Thick Film; Features: Automotive AEC-Q200; Operating Temperature: -55°C ~ 155°C; Height - Seated (Max): 0.50mm; Category: Resistor
footprint R0603
pins: 1, 2

## R-340K-0402
designator R?, comment Package: 0402  (hidden comment: 340K)
RES 340K OHM 1% 1/16W 0402; Manufacturer Part Number: RC0402FR-07340KL; Manufacturer: YAGEO; Tolerance: 0.01; Power: 0.063W; Temperature Coefficient: ±100ppm/°C; Object  Type: Part; Design Item ID: R-340K-0402; Value: 340K; Composition: Thick Film; Features: Moisture Resistant; Operating Temperature: -55°C ~ 155°C; Height - Seated (Max): 0.40mm; Category: Resistor
footprint R0402
pins: 1, 2

## R-340K-0603
designator R?, comment Package: 0603  (hidden comment: 340K)
RES SMD 340K OHM 1% 1/10W 0603; Manufacturer Part Number: CRCW0603340KFKEA; Manufacturer: Vishay Dale; Tolerance: 0.01; Power: 0.1W; Temperature Coefficient: ±100ppm/°C; Object  Type: Part; Design Item ID: R-340K-0603; Value: 340K; Composition: Thick Film; Features: Automotive AEC-Q200; Operating Temperature: -55°C ~ 155°C; Height - Seated (Max): 0.50mm; Category: Resistor
footprint R0603
pins: 1, 2

## R-340R-0402
designator R?, comment Package: 0402  (hidden comment: 340R)
RES 340 OHM 1% 1/16W 0402; Manufacturer Part Number: RC0402FR-07340RL; Manufacturer: YAGEO; Tolerance: 0.01; Power: 0.063W; Temperature Coefficient: ±100ppm/°C; Object  Type: Part; Design Item ID: R-340R-0402; Value: 340R; Composition: Thick Film; Features: Moisture Resistant; Operating Temperature: -55°C ~ 155°C; Height - Seated (Max): 0.40mm; Category: Resistor
footprint R0402
pins: 1, 2

## R-340R-0603
designator R?, comment Package: 0603  (hidden comment: 340R)
RES SMD 340 OHM 1% 1/10W 0603; Manufacturer Part Number: CRCW0603340RFKEA; Manufacturer: Vishay Dale; Tolerance: 0.01; Power: 0.1W; Temperature Coefficient: ±100ppm/°C; Object  Type: Part; Design Item ID: R-340R-0603; Value: 340R; Composition: Thick Film; Features: Automotive AEC-Q200; Operating Temperature: -55°C ~ 155°C; Height - Seated (Max): 0.50mm; Category: Resistor
footprint R0603
pins: 1, 2

## R-348K-0402
designator R?, comment Package: 0402  (hidden comment: 348K)
RES 348K OHM 1% 1/16W 0402; Manufacturer Part Number: RC0402FR-07348KL; Manufacturer: YAGEO; Tolerance: 0.01; Power: 0.063W; Temperature Coefficient: ±100ppm/°C; Object  Type: Part; Design Item ID: R-348K-0402; Composition: Thick Film; Features: Moisture Resistant; Operating Temperature: -55°C ~ 155°C; Height - Seated (Max): 0.40mm; Category: Resistor; Value: 348K
footprint R0402
pins: 1, 2

## R-348K-0603
designator R?, comment Package: 0603  (hidden comment: 348K)
RES SMD 348K OHM 1% 1/10W 0603; Manufacturer Part Number: CRCW0603348KFKEA; Manufacturer: Vishay Dale; Tolerance: 0.01; Power: 0.1W; Temperature Coefficient: ±100ppm/°C; Object  Type: Part; Design Item ID: R-348K-0603; Value: 348K; Composition: Thick Film; Features: Automotive AEC-Q200; Operating Temperature: -55°C ~ 155°C; Height - Seated (Max): 0.50mm; Category: Resistor
footprint R0603
pins: 1, 2

## R-348R-0402
designator R?, comment Package: 0402  (hidden comment: 348R)
RES 348 OHM 1% 1/16W 0402; Manufacturer Part Number: RC0402FR-07348RL; Manufacturer: YAGEO; Tolerance: 0.01; Power: 0.063W; Temperature Coefficient: ±100ppm/°C; Object  Type: Part; Design Item ID: R-348R-0402; Value: 348R; Composition: Thick Film; Features: Moisture Resistant; Operating Temperature: -55°C ~ 155°C; Height - Seated (Max): 0.40mm; Category: Resistor
footprint R0402
pins: 1, 2

## R-348R-0603
designator R?, comment Package: 0603  (hidden comment: 348R)
RES SMD 348 OHM 1% 1/10W 0603; Manufacturer Part Number: CRCW0603348RFKEA; Manufacturer: Vishay Dale; Tolerance: 0.01; Power: 0.1W; Temperature Coefficient: ±100ppm/°C; Object  Type: Part; Design Item ID: R-348R-0603; Composition: Thick Film; Features: Automotive AEC-Q200; Operating Temperature: -55°C ~ 155°C; Height - Seated (Max): 0.50mm; Category: Resistor; Value: 348R
footprint R0603
pins: 1, 2

## R-350mR-2512
designator R?, comment Package: 2512  (hidden comment: 350mR)